# Altium schematic symbol library FPGA_Xilinx_Virtex7.SchLib: 34 symbols (part 33 of 34)
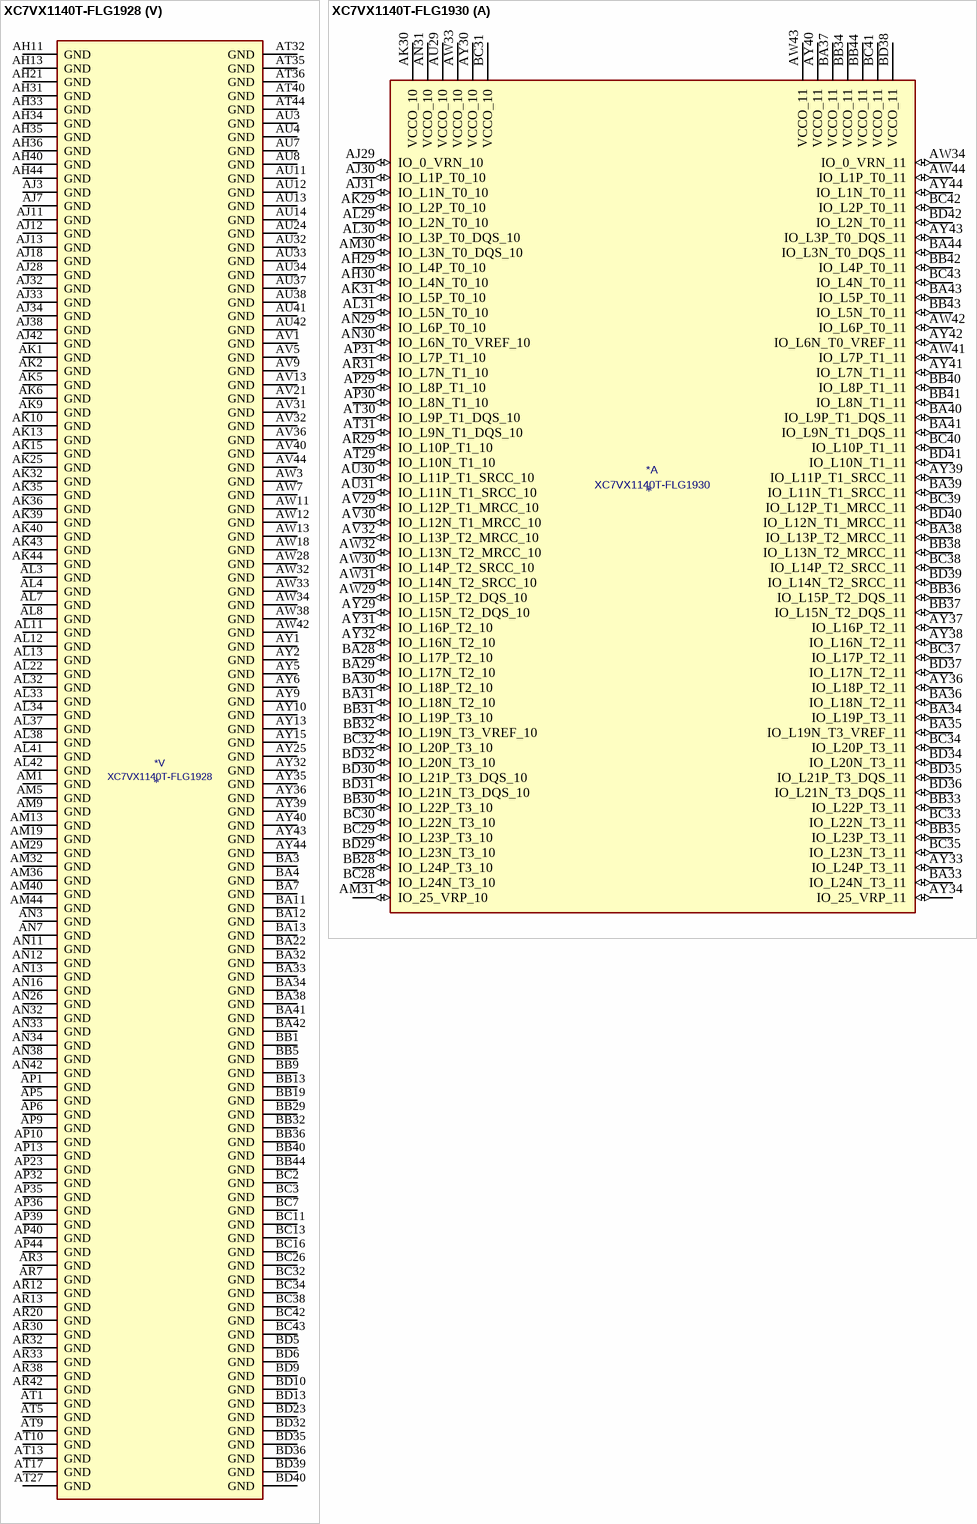
[diagram p204: symbols XC7VX1140T-FLG1928 to XC7VX1140T-FLG1930]

## XC7VX1140T-FLG1928
designator *  value XC7VX1140T-FLG1928
ki_keywords: FPGA; ki_description: Virtex 7 XT 1140 XC7VX1140T-FLG1928
part A pins: AG28 IO_L1P_T0_D00_MOSI_14 (io), AG30 IO_L2P_T0_D02_14 (io), AH25 IO_L2P_T0_13 (io), AH26 VCCO_13 (power), AH27 IO_L1P_T0_13 (io), AH28 IO_L1N_T0_D01_DIN_14 (io), AH29 IO_L3P_T0_DQS_PUDC_B_14 (io), AH30 IO_L2N_T0_D03_14 (io), AJ25 IO_L2N_T0_13 (io), AJ26 IO_L4P_T0_13 (io), AJ27 IO_L1N_T0_13 (io), AJ29 IO_L3N_T0_DQS_EMCCLK_14 (io), AJ30 IO_L4P_T0_D04_14 (io), AJ31 IO_L4N_T0_D05_14 (io), AK26 IO_L4N_T0_13 (io), AK27 IO_25_VRP_13 (io), AK28 IO_L5P_T0_D06_14 (io), AK29 IO_L5N_T0_D07_14 (io), AK30 VCCO_14 (power), AK31 IO_0_VRN_14 (io), AL25 IO_0_VRN_13 (io), AL26 IO_L5P_T0_13 (io), AL27 VCCO_13 (power), AL28 IO_25_VRP_14 (io), AL29 IO_L6P_T0_FCS_B_14 (io), AL30 IO_L6N_T0_D08_VREF_14 (io), AL31 IO_L7P_T1_D09_14 (io), AM25 IO_L3P_T0_DQS_13 (io), AM26 IO_L5N_T0_13 (io), AM27 IO_L6P_T0_13 (io), AM28 IO_L9P_T1_DQS_14 (io), AM30 IO_L8P_T1_D11_14 (io), AM31 IO_L7N_T1_D10_14 (io), AN25 IO_L3N_T0_DQS_13 (io), AN27 IO_L6N_T0_VREF_13 (io), AN28 IO_L9N_T1_DQS_D13_14 (io), AN29 IO_L10P_T1_D14_14 (io), AN30 IO_L8N_T1_D12_14 (io), AN31 VCCO_14 (power), AP25 IO_L8P_T1_13 (io), AP26 IO_L8N_T1_13 (io), AP27 IO_L9P_T1_DQS_13 (io), AP28 VCCO_14 (power), AP29 IO_L12P_T1_MRCC_14 (io), AP30 IO_L10N_T1_D15_14 (io), AP31 IO_L11P_T1_SRCC_14 (io), AR25 VCCO_13 (power), AR26 IO_L7P_T1_13 (io), AR27 IO_L9N_T1_DQS_13 (io), AR28 IO_L14P_T2_SRCC_14 (io), AR29 IO_L12N_T1_MRCC_14 (io), AR31 IO_L11N_T1_SRCC_14 (io), AT25 IO_L10P_T1_13 (io), AT26 IO_L7N_T1_13 (io), AT28 IO_L14N_T2_SRCC_14 (io), AT29 IO_L13P_T2_MRCC_14 (io), AT30 IO_L13N_T2_MRCC_14 (io), AT31 IO_L15P_T2_DQS_RDWR_B_14 (io), AU25 IO_L11P_T1_SRCC_13 (io), AU26 IO_L10N_T1_13 (io), AU27 IO_L12P_T1_MRCC_13 (io), AU28 IO_L12N_T1_MRCC_13 (io), AU29 VCCO_14 (power), AU30 IO_L17P_T2_A14_D30_14 (io), AU31 IO_L15N_T2_DQS_DOUT_CSO_B_14 (io), AV25 IO_L11N_T1_SRCC_13 (io), AV26 VCCO_13 (power), AV27 IO_L14P_T2_SRCC_13 (io), AV28 IO_L14N_T2_SRCC_13 (io), AV29 IO_L18P_T2_A12_D28_14 (io), AV30 IO_L17N_T2_A13_D29_14 (io), AW25 IO_L13P_T2_MRCC_13 (io), AW26 IO_L13N_T2_MRCC_13 (io), AW27 IO_L15P_T2_DQS_13 (io), AW29 IO_L18N_T2_A11_D27_14 (io), AW30 IO_L16P_T2_CSI_B_14 (io), AW31 IO_L16N_T2_A15_D31_14 (io), AY26 IO_L18P_T2_13 (io), AY27 IO_L15N_T2_DQS_13 (io), AY28 IO_L17P_T2_13 (io), AY29 IO_L19P_T3_A10_D26_14 (io), AY30 VCCO_14 (power), AY31 IO_L20P_T3_A08_D24_14 (io), BA24 IO_L16P_T2_13 (io), BA25 IO_L16N_T2_13 (io), BA26 IO_L18N_T2_13 (io), BA27 VCCO_13 (power), BA28 IO_L17N_T2_13 (io), BA29 IO_L19N_T3_A09_D25_VREF_14 (io), BA30 IO_L22P_T3_A05_D21_14 (io), BA31 IO_L20N_T3_A07_D23_14 (io), BB24 VCCO_13 (power), BB25 IO_L19P_T3_13 (io), BB26 IO_L19N_T3_VREF_13 (io), BB27 IO_L20P_T3_13 (io), BB28 IO_L24P_T3_13 (io), BB30 IO_L24P_T3_A01_D17_14 (io), BB31 IO_L22N_T3_A04_D20_14 (io), BC24 IO_L21P_T3_DQS_13 (io), BC25 IO_L21N_T3_DQS_13 (io), BC27 IO_L20N_T3_13 (io), BC28 IO_L24N_T3_13 (io), BC29 IO_L23P_T3_A03_D19_14 (io), BC30 IO_L24N_T3_A00_D16_14 (io), BC31 VCCO_14 (power), BD24 IO_L23P_T3_13 (io), BD25 IO_L23N_T3_13 (io), BD26 IO_L22P_T3_13 (io), BD27 IO_L22N_T3_13 (io), BD28 VCCO_13 (power), BD29 IO_L23N_T3_A02_D18_14 (io), BD30 IO_L21P_T3_DQS_14 (io), BD31 IO_L21N_T3_DQS_A06_D22_14 (io)
part B pins: A25 IO_L16P_T2_16 (io), A26 IO_L16N_T2_16 (io), A27 VCCO_16 (power), A28 IO_L15N_T2_DQS_16 (io), A29 IO_L24P_T3_RS1_15 (io), A30 IO_L24N_T3_RS0_15 (io), A31 IO_L23N_T3_FWE_B_15 (io), B25 IO_L18N_T2_16 (io), B26 IO_L17P_T2_16 (io), B27 IO_L17N_T2_16 (io), B28 IO_L15P_T2_DQS_16 (io), B30 IO_L22N_T3_A16_15 (io), B31 IO_L23P_T3_FOE_B_15 (io), C25 IO_L18P_T2_16 (io), C27 IO_L19P_T3_16 (io), C28 IO_L19N_T3_VREF_16 (io), C29 IO_L22P_T3_A17_15 (io), C30 IO_L21N_T3_DQS_A18_15 (io), C31 VCCO_15 (power), D25 IO_L13P_T2_MRCC_16 (io), D26 IO_L13N_T2_MRCC_16 (io), D27 IO_L11N_T1_SRCC_16 (io), D28 VCCO_15 (power), D29 IO_L20N_T3_A19_15 (io), D30 IO_L21P_T3_DQS_15 (io), D31 IO_L19N_T3_A21_VREF_15 (io), E25 VCCO_16 (power), E26 IO_L14N_T2_SRCC_16 (io), E27 IO_L11P_T1_SRCC_16 (io), E28 IO_L12N_T1_MRCC_16 (io), E29 IO_L20P_T3_A20_15 (io), E31 IO_L19P_T3_A22_15 (io), F26 IO_L14P_T2_SRCC_16 (io), F28 IO_L12P_T1_MRCC_16 (io), F29 IO_L17P_T2_A26_15 (io), F30 IO_L17N_T2_A25_15 (io), F31 IO_L18N_T2_A23_15 (io), G26 IO_L7P_T1_16 (io), G27 IO_L7N_T1_16 (io), G28 IO_L6N_T0_VREF_16 (io), G29 VCCO_15 (power), G30 IO_L15N_T2_DQS_ADV_B_15 (io), G31 IO_L18P_T2_A24_15 (io), H26 VCCO_16 (power), H27 IO_L10N_T1_16 (io), H28 IO_L6P_T0_16 (io), H29 IO_L15P_T2_DQS_15 (io), H30 IO_L16N_T2_A27_15 (io), J26 IO_L9N_T1_DQS_16 (io), J27 IO_L10P_T1_16 (io), J29 IO_L13N_T2_MRCC_15 (io), J30 IO_L16P_T2_A28_15 (io), J31 IO_L14N_T2_SRCC_15 (io), K26 IO_L9P_T1_DQS_16 (io), K27 IO_L8P_T1_16 (io), K28 IO_L8N_T1_16 (io), K29 IO_L13P_T2_MRCC_15 (io), K30 VCCO_15 (power), K31 IO_L14P_T2_SRCC_15 (io), L26 IO_25_VRP_16 (io), L27 VCCO_16 (power), L28 IO_0_VRN_16 (io), L29 IO_L12P_T1_MRCC_15 (io), L30 IO_L12N_T1_MRCC_15 (io), L31 IO_L11N_T1_SRCC_15 (io), M26 IO_L10P_T1_AD11P_15 (io), M27 IO_L10N_T1_AD11N_15 (io), M28 IO_L8N_T1_AD10N_15 (io), M30 IO_L9N_T1_DQS_AD3N_15 (io), M31 IO_L11P_T1_SRCC_15 (io), N27 IO_L8P_T1_AD10P_15 (io), N28 IO_L7P_T1_AD2P_15 (io), N29 IO_L7N_T1_AD2N_15 (io), N30 IO_L9P_T1_DQS_AD3P_15 (io), N31 VCCO_15 (power), P26 IO_L2N_T0_AD8N_15 (io), P27 IO_L4N_T0_15 (io), P28 VCCO_15 (power), P29 IO_L6P_T0_15 (io), P30 IO_L6N_T0_VREF_15 (io), P31 IO_L5N_T0_AD9N_15 (io), R26 IO_L2P_T0_AD8P_15 (io), R27 IO_L4P_T0_15 (io), R28 IO_L1N_T0_AD0N_15 (io), R29 IO_L3N_T0_DQS_AD1N_15 (io), R31 IO_L5P_T0_AD9P_15 (io), T26 IO_0_VRN_15 (io), T28 IO_L1P_T0_AD0P_15 (io), T29 IO_L3P_T0_DQS_AD1P_15 (io), T30 IO_25_VRP_15 (io)
part C pins: AG16 IO_25_VRP_34 (io), AG20 IO_0_VRN_33 (io), AH14 IO_0_VRN_34 (io), AH15 IO_L1P_T0_34 (io), AH16 VCCO_34 (power), AH17 IO_L1P_T0_33 (io), AH18 IO_L2N_T0_33 (io), AH19 IO_L2P_T0_33 (io), AH20 IO_L4P_T0_33 (io), AJ14 IO_L2P_T0_34 (io), AJ15 IO_L1N_T0_34 (io), AJ16 IO_L3P_T0_DQS_34 (io), AJ17 IO_L1N_T0_33 (io), AJ19 IO_L3P_T0_DQS_33 (io), AJ20 IO_L4N_T0_33 (io), AK14 IO_L2N_T0_34 (io), AK16 IO_L3N_T0_DQS_34 (io), AK17 IO_25_VRP_33 (io), AK18 IO_L5P_T0_33 (io), AK19 IO_L3N_T0_DQS_33 (io), AK20 VCCO_33 (power), AL14 IO_L4N_T0_34 (io), AL15 IO_L4P_T0_34 (io), AL16 IO_L5P_T0_34 (io), AL17 VCCO_33 (power), AL18 IO_L5N_T0_33 (io), AL19 IO_L6N_T0_VREF_33 (io), AL20 IO_L6P_T0_33 (io), AM14 VCCO_34 (power), AM15 IO_L6P_T0_34 (io), AM16 IO_L5N_T0_34 (io), AM17 IO_L7N_T1_33 (io), AM18 IO_L7P_T1_33 (io), AM20 IO_L8P_T1_33 (io), AN14 IO_L8P_T1_34 (io), AN15 IO_L6N_T0_VREF_34 (io), AN17 IO_L9P_T1_DQS_33 (io), AN18 IO_L10N_T1_33 (io), AN19 IO_L10P_T1_33 (io), AN20 IO_L8N_T1_33 (io), AP14 IO_L8N_T1_34 (io), AP15 IO_L10P_T1_34 (io), AP16 IO_L7P_T1_34 (io), AP17 IO_L9N_T1_DQS_33 (io), AP18 VCCO_33 (power), AP19 IO_L11N_T1_SRCC_33 (io), AP20 IO_L11P_T1_SRCC_33 (io), AR14 IO_L10N_T1_34 (io), AR15 VCCO_34 (power), AR16 IO_L7N_T1_34 (io), AR17 IO_L9P_T1_DQS_34 (io), AR18 IO_L12N_T1_MRCC_33 (io), AR19 IO_L12P_T1_MRCC_33 (io), AT14 IO_L12N_T1_MRCC_34 (io), AT15 IO_L12P_T1_MRCC_34 (io), AT16 IO_L9N_T1_DQS_34 (io), AT18 IO_L14N_T2_SRCC_33 (io), AT19 IO_L14P_T2_SRCC_33 (io), AT20 IO_L13P_T2_MRCC_33 (io), AU15 IO_L13P_T2_MRCC_34 (io), AU16 IO_L11N_T1_SRCC_34 (io), AU17 IO_L11P_T1_SRCC_34 (io), AU18 IO_L18P_T2_33 (io), AU19 VCCO_33 (power), AU20 IO_L13N_T2_MRCC_33 (io), AV14 IO_L15P_T2_DQS_34 (io), AV15 IO_L13N_T2_MRCC_34 (io), AV16 VCCO_34 (power), AV17 IO_L14P_T2_SRCC_34 (io), AV18 IO_L18N_T2_33 (io), AV19 IO_L17P_T2_33 (io), AV20 IO_L15P_T2_DQS_33 (io), AW14 IO_L15N_T2_DQS_34 (io), AW15 IO_L17N_T2_34 (io), AW16 IO_L17P_T2_34 (io), AW17 IO_L14N_T2_SRCC_34 (io), AW19 IO_L17N_T2_33 (io), AW20 IO_L15N_T2_DQS_33 (io), AY14 IO_L16P_T2_34 (io), AY16 IO_L18N_T2_34 (io), AY17 IO_L18P_T2_34 (io), AY18 IO_L16N_T2_33 (io), AY19 IO_L16P_T2_33 (io), AY20 VCCO_33 (power), AY21 IO_L20P_T3_33 (io), BA14 IO_L16N_T2_34 (io), BA15 IO_L19N_T3_VREF_34 (io), BA16 IO_L19P_T3_34 (io), BA17 VCCO_34 (power), BA18 IO_L21P_T3_DQS_33 (io), BA19 IO_L19N_T3_VREF_33 (io), BA20 IO_L19P_T3_33 (io), BA21 IO_L20N_T3_33 (io), BB14 VCCO_34 (power), BB15 IO_L20N_T3_34 (io), BB16 IO_L20P_T3_34 (io), BB17 IO_L22P_T3_34 (io), BB18 IO_L21N_T3_DQS_33 (io), BB20 IO_L22P_T3_33 (io), BC14 IO_L21N_T3_DQS_34 (io), BC15 IO_L21P_T3_DQS_34 (io), BC17 IO_L22N_T3_34 (io), BC18 IO_L23N_T3_33 (io), BC19 IO_L23P_T3_33 (io), BC20 IO_L22N_T3_33 (io), BD14 IO_L23N_T3_34 (io), BD15 IO_L23P_T3_34 (io), BD16 IO_L24N_T3_34 (io), BD17 IO_L24P_T3_34 (io), BD18 VCCO_33 (power), BD19 IO_L24N_T3_33 (io), BD20 IO_L24P_T3_33 (io)
part D pins: A23 IO_L24P_T3_36 (io), A24 IO_L24N_T3_36 (io), AG22 IO_0_VRN_35 (io), AH22 IO_L4P_T0_35 (io), AH23 IO_L2P_T0_AD12P_35 (io), AH24 IO_L2N_T0_AD12N_35 (io), AJ21 IO_L5P_T0_AD13P_35 (io), AJ22 IO_L4N_T0_35 (io), AJ23 VCCO_35 (power), AJ24 IO_L1P_T0_AD4P_35 (io), AK21 IO_L5N_T0_AD13N_35 (io), AK22 IO_L3P_T0_DQS_AD5P_35 (io), AK23 IO_L3N_T0_DQS_AD5N_35 (io), AK24 IO_L1N_T0_AD4N_35 (io), AL21 IO_25_VRP_35 (io), AL23 IO_L6P_T0_35 (io), AL24 IO_L6N_T0_VREF_35 (io), AM21 IO_L7P_T1_AD6P_35 (io), AM22 IO_L7N_T1_AD6N_35 (io), AM23 IO_L8P_T1_AD14P_35 (io), AM24 VCCO_35 (power), AN21 VCCO_35 (power), AN22 IO_L9P_T1_DQS_AD7P_35 (io), AN23 IO_L8N_T1_AD14N_35 (io), AN24 IO_L10P_T1_AD15P_35 (io), AP21 IO_L11P_T1_SRCC_35 (io), AP22 IO_L9N_T1_DQS_AD7N_35 (io), AP24 IO_L10N_T1_AD15N_35 (io), AR21 IO_L11N_T1_SRCC_35 (io), AR22 IO_L12P_T1_MRCC_35 (io), AR23 IO_L12N_T1_MRCC_35 (io), AR24 IO_L13P_T2_MRCC_35 (io), AT21 IO_L15P_T2_DQS_35 (io), AT22 VCCO_35 (power), AT23 IO_L14P_T2_SRCC_35 (io), AT24 IO_L13N_T2_MRCC_35 (io), AU21 IO_L15N_T2_DQS_35 (io), AU22 IO_L16P_T2_35 (io), AU23 IO_L14N_T2_SRCC_35 (io), AV22 IO_L16N_T2_35 (io), AV23 IO_L18P_T2_35 (io), AV24 IO_L18N_T2_35 (io), AW21 IO_L17P_T2_35 (io), AW22 IO_L17N_T2_35 (io), AW23 VCCO_35 (power), AW24 IO_L20P_T3_35 (io), AY22 IO_L19P_T3_35 (io), AY23 IO_L19N_T3_VREF_35 (io), AY24 IO_L20N_T3_35 (io), B22 IO_L21N_T3_DQS_36 (io), B23 IO_L23N_T3_36 (io), B24 VCCO_36 (power), BA23 IO_L22P_T3_35 (io), BB21 IO_L21P_T3_DQS_35 (io), BB22 IO_L21N_T3_DQS_35 (io), BB23 IO_L22N_T3_35 (io), BC21 VCCO_35 (power), BC22 IO_L24P_T3_35 (io), BC23 IO_L24N_T3_35 (io), BD21 IO_L23P_T3_35 (io), BD22 IO_L23N_T3_35 (io), C22 IO_L21P_T3_DQS_36 (io), C23 IO_L23P_T3_36 (io), C24 IO_L22N_T3_36 (io), D22 IO_L20N_T3_36 (io), D24 IO_L22P_T3_36 (io), E22 IO_L20P_T3_36 (io), E23 IO_L19P_T3_36 (io), E24 IO_L19N_T3_VREF_36 (io), F22 VCCO_36 (power), F23 IO_L17P_T2_36 (io), F24 IO_L17N_T2_36 (io), F25 IO_L18N_T2_36 (io), G22 IO_L15P_T2_DQS_36 (io), G23 IO_L15N_T2_DQS_36 (io), G25 IO_L18P_T2_36 (io), H22 IO_L13P_T2_MRCC_36 (io), H23 IO_L13N_T2_MRCC_36 (io), H24 IO_L16P_T2_36 (io), H25 IO_L16N_T2_36 (io), J22 IO_L12N_T1_MRCC_36 (io), J23 VCCO_36 (power), J24 IO_L14P_T2_SRCC_36 (io), J25 IO_L14N_T2_SRCC_36 (io), K22 IO_L12P_T1_MRCC_36 (io), K23 IO_L11P_T1_SRCC_36 (io), K24 IO_L11N_T1_SRCC_36 (io), L23 IO_L7P_T1_36 (io), L24 IO_L7N_T1_36 (io), L25 IO_L9N_T1_DQS_36 (io), M22 IO_L10P_T1_36 (io), M23 IO_L10N_T1_36 (io), M24 VCCO_36 (power), M25 IO_L9P_T1_DQS_36 (io), N22 IO_L8P_T1_36 (io), N23 IO_L8N_T1_36 (io), N24 IO_L6P_T0_36 (io), N25 IO_L6N_T0_VREF_36 (io), P21 IO_L2N_T0_36 (io), P22 IO_L4N_T0_36 (io), P24 IO_L3N_T0_DQS_36 (io), P25 IO_25_VRP_36 (io), R21 IO_L2P_T0_36 (io), R22 IO_L4P_T0_36 (io), R23 IO_L1N_T0_36 (io), R24 IO_L3P_T0_DQS_36 (io), R25 VCCO_36 (power), T21 IO_0_VRN_36 (io), T22 VCCO_36 (power), T23 IO_L1P_T0_36 (io), T24 IO_L5P_T0_36 (io), T25 IO_L5N_T0_36 (io)
part E pins: A14 IO_L24N_T3_37 (io), A15 IO_L24P_T3_37 (io), A16 IO_L23N_T3_37 (io), A17 VCCO_37 (power), A18 IO_L20N_T3_38 (io), A19 IO_L20P_T3_38 (io), A20 IO_L22N_T3_38 (io), A21 IO_L24N_T3_38 (io), B14 VCCO_37 (power), B15 IO_L22N_T3_37 (io), B16 IO_L23P_T3_37 (io), B17 IO_L21N_T3_DQS_37 (io), B18 IO_L23N_T3_38 (io), B20 IO_L22P_T3_38 (io), B21 IO_L24P_T3_38 (io), C14 IO_L20N_T3_37 (io), C15 IO_L22P_T3_37 (io), C17 IO_L21P_T3_DQS_37 (io), C18 IO_L23P_T3_38 (io), C19 IO_L21N_T3_DQS_38 (io), C20 IO_L21P_T3_DQS_38 (io), C21 VCCO_38 (power), D14 IO_L20P_T3_37 (io), D15 IO_L19N_T3_VREF_37 (io), D16 IO_L19P_T3_37 (io), D17 IO_L15N_T2_DQS_38 (io), D18 VCCO_38 (power), D19 IO_L17N_T2_38 (io), D20 IO_L19N_T3_VREF_38 (io), D21 IO_L19P_T3_38 (io), E14 IO_L18N_T2_37 (io), E15 VCCO_37 (power), E16 IO_L17N_T2_37 (io), E17 IO_L17P_T2_37 (io), E18 IO_L15P_T2_DQS_38 (io), E19 IO_L17P_T2_38 (io), E21 IO_L18N_T2_38 (io), F14 IO_L18P_T2_37 (io), F15 IO_L16N_T2_37 (io), F16 IO_L15N_T2_DQS_37 (io), F18 IO_L13N_T2_MRCC_38 (io), F19 IO_L16N_T2_38 (io), F20 IO_L16P_T2_38 (io), F21 IO_L18P_T2_38 (io), G15 IO_L16P_T2_37 (io), G16 IO_L15P_T2_DQS_37 (io), G17 IO_L13N_T2_MRCC_37 (io), G18 IO_L13P_T2_MRCC_38 (io), G19 VCCO_38 (power), G20 IO_L14N_T2_SRCC_38 (io), G21 IO_L14P_T2_SRCC_38 (io), H14 IO_L14N_T2_SRCC_37 (io), H15 IO_L14P_T2_SRCC_37 (io), H16 VCCO_37 (power), H17 IO_L13P_T2_MRCC_37 (io), H18 IO_L12N_T1_MRCC_38 (io), H19 IO_L12P_T1_MRCC_38 (io), H20 IO_L11N_T1_SRCC_38 (io), J14 IO_L11N_T1_SRCC_37 (io), J15 IO_L11P_T1_SRCC_37 (io), J16 IO_L12N_T1_MRCC_37 (io), J17 IO_L12P_T1_MRCC_37 (io), J19 IO_L10N_T1_38 (io), J20 IO_L11P_T1_SRCC_38 (io), J21 IO_L9N_T1_DQS_38 (io), K14 IO_L9N_T1_DQS_37 (io), K16 IO_L7N_T1_37 (io), K17 IO_L7P_T1_37 (io), K18 IO_L8N_T1_38 (io), K19 IO_L10P_T1_38 (io), K20 VCCO_38 (power), K21 IO_L9P_T1_DQS_38 (io), L14 IO_L9P_T1_DQS_37 (io), L15 IO_L10N_T1_37 (io), L16 IO_L10P_T1_37 (io), L17 VCCO_37 (power), L18 IO_L6N_T0_VREF_38 (io), L19 IO_L8P_T1_38 (io), L20 IO_L7N_T1_38 (io), L21 IO_L7P_T1_38 (io), M14 VCCO_37 (power), M15 IO_L6N_T0_VREF_37 (io), M16 IO_L8N_T1_37 (io), M17 IO_L8P_T1_37 (io), M18 IO_L6P_T0_38 (io), M20 IO_L3N_T0_DQS_38 (io), M21 IO_L3P_T0_DQS_38 (io), N14 IO_25_VRP_37 (io), N15 IO_L6P_T0_37 (io), N17 IO_L2N_T0_37 (io), N18 IO_0_VRN_38 (io), N19 IO_L2N_T0_38 (io), N20 IO_L1N_T0_38 (io), N21 VCCO_38 (power), P14 IO_L3N_T0_DQS_37 (io), P15 IO_L3P_T0_DQS_37 (io), P16 IO_L4N_T0_37 (io), P17 IO_L2P_T0_37 (io), P18 VCCO_38 (power), P19 IO_L2P_T0_38 (io), P20 IO_L1P_T0_38 (io), R14 IO_L5N_T0_37 (io), R15 VCCO_37 (power), R16 IO_L4P_T0_37 (io), R17 IO_0_VRN_37 (io), R18 IO_L4N_T0_38 (io), R19 IO_L5N_T0_38 (io), T14 IO_L5P_T0_37 (io), T15 IO_L1N_T0_37 (io), T16 IO_L1P_T0_37 (io), T18 IO_L4P_T0_38 (io), T19 IO_L5P_T0_38 (io), T20 IO_25_VRP_38 (io)
part F pins: AR9 MGTREFCLK0N_111 (io), AR10 MGTREFCLK0P_111 (io), AT11 MGTREFCLK1N_111 (io), AT12 MGTREFCLK1P_111 (io), AU9 MGTREFCLK0N_110 (io), AU10 MGTREFCLK0P_110 (io), AV11 MGTREFCLK1N_110 (io), AV12 MGTREFCLK1P_110 (io), AW1 MGTHTXN3_111 (io), AW2 MGTHTXP3_111 (io), AW5 MGTHRXN3_111 (io), AW6 MGTHRXP3_111 (io), AW9 MGTHRXN2_111 (io), AW10 MGTHRXP2_111 (io), AY3 MGTHTXN2_111 (io), AY4 MGTHTXP2_111 (io), AY7 MGTHRXN1_111 (io), AY8 MGTHRXP1_111 (io), BA1 MGTHTXN1_111 (io), BA2 MGTHTXP1_111 (io), BA5 MGTHTXN0_111 (io), BA6 MGTHTXP0_111 (io), BA9 MGTHRXN0_111 (io), BA10 MGTHRXP0_111 (io), BB3 MGTHTXN3_110 (io), BB4 MGTHTXP3_110 (io), BB7 MGTHRXN3_110 (io), BB8 MGTHRXP3_110 (io), BB11 MGTHRXN2_110 (io), BB12 MGTHRXP2_110 (io), BC5 MGTHTXN2_110 (io), BC6 MGTHTXP2_110 (io), BC9 MGTHRXN1_110 (io), BC10 MGTHRXP1_110 (io), BD3 MGTHTXN1_110 (io), BD4 MGTHTXP1_110 (io), BD7 MGTHTXN0_110 (io), BD8 MGTHTXP0_110 (io), BD11 MGTHRXN0_110 (io), BD12 MGTHRXP0_110 (io)
part G pins: AL1 MGTHTXN3_113 (io), AL2 MGTHTXP3_113 (io), AL5 MGTHRXN3_113 (io), AL6 MGTHRXP3_113 (io), AL9 MGTREFCLK0N_113 (io), AL10 MGTREFCLK0P_113 (io), AM3 MGTHTXN2_113 (io), AM4 MGTHTXP2_113 (io), AM7 MGTHRXN2_113 (io), AM8 MGTHRXP2_113 (io), AM11 MGTREFCLK1N_113 (io), AM12 MGTREFCLK1P_113 (io), AN1 MGTHTXN1_113 (io), AN2 MGTHTXP1_113 (io), AN5 MGTHRXN1_113 (io), AN6 MGTHRXP1_113 (io), AN9 MGTREFCLK0N_112 (io), AN10 MGTREFCLK0P_112 (io), AP3 MGTHTXN0_113 (io), AP4 MGTHTXP0_113 (io), AP7 MGTHRXN0_113 (io), AP8 MGTHRXP0_113 (io), AP11 MGTREFCLK1N_112 (io), AP12 MGTREFCLK1P_112 (io), AR1 MGTHTXN3_112 (io), AR2 MGTHTXP3_112 (io), AR5 MGTHRXN3_112 (io), AR6 MGTHRXP3_112 (io), AT3 MGTHTXN2_112 (io), AT4 MGTHTXP2_112 (io), AT7 MGTHRXN2_112 (io), AT8 MGTHRXP2_112 (io), AU1 MGTHTXN1_112 (io), AU2 MGTHTXP1_112 (io), AU5 MGTHRXN1_112 (io), AU6 MGTHRXP1_112 (io), AV3 MGTHTXN0_112 (io), AV4 MGTHTXP0_112 (io), AV7 MGTHRXN0_112 (io), AV8 MGTHRXP0_112 (io)
part H pins: AC1 MGTHTXN3_115 (io), AC2 MGTHTXP3_115 (io), AC5 MGTHRXN3_115 (io), AC6 MGTHRXP3_115 (io), AC9 MGTREFCLK0N_115 (io), AC10 MGTREFCLK0P_115 (io), AD3 MGTHTXN2_115 (io), AD4 MGTHTXP2_115 (io), AD7 MGTHRXN2_115 (io), AD8 MGTHRXP2_115 (io), AE1 MGTHTXN1_115 (io), AE2 MGTHTXP1_115 (io), AE5 MGTHRXN1_115 (io), AE6 MGTHRXP1_115 (io), AE9 MGTREFCLK1N_115 (io), AE10 MGTREFCLK1P_115 (io), AF3 MGTHTXN0_115 (io), AF4 MGTHTXP0_115 (io), AF7 MGTHRXN0_115 (io), AF8 MGTHRXP0_115 (io), AG1 MGTHTXN3_114 (io), AG2 MGTHTXP3_114 (io), AG5 MGTHRXN3_114 (io), AG6 MGTHRXP3_114 (io), AG9 MGTREFCLK0N_114 (io), AG10 MGTREFCLK0P_114 (io), AH3 MGTHTXN2_114 (io), AH4 MGTHTXP2_114 (io), AH7 MGTHRXN2_114 (io), AH8 MGTHRXP2_114 (io), AJ1 MGTHTXN1_114 (io), AJ2 MGTHTXP1_114 (io), AJ5 MGTHRXN1_114 (io), AJ6 MGTHRXP1_114 (io), AJ9 MGTREFCLK1N_114 (io), AJ10 MGTREFCLK1P_114 (io), AK3 MGTHTXN0_114 (io), AK4 MGTHTXP0_114 (io), AK7 MGTHRXN0_114 (io), AK8 MGTHRXP0_114 (io)
part I pins: AA1 MGTHTXN1_116 (io), AA2 MGTHTXP1_116 (io), AA5 MGTHRXN1_116 (io), AA6 MGTHRXP1_116 (io), AA9 MGTREFCLK1N_116 (io), AA10 MGTREFCLK1P_116 (io), AB3 MGTHTXN0_116 (io), AB4 MGTHTXP0_116 (io), AB7 MGTHRXN0_116 (io), AB8 MGTHRXP0_116 (io), R1 MGTHTXN3_117 (io), R2 MGTHTXP3_117 (io), R5 MGTHRXN3_117 (io), R6 MGTHRXP3_117 (io), R9 MGTREFCLK0N_117 (io), R10 MGTREFCLK0P_117 (io), T3 MGTHTXN2_117 (io), T4 MGTHTXP2_117 (io), T7 MGTHRXN2_117 (io), T8 MGTHRXP2_117 (io), U1 MGTHTXN1_117 (io), U2 MGTHTXP1_117 (io), U5 MGTHRXN1_117 (io), U6 MGTHRXP1_117 (io), U9 MGTREFCLK1N_117 (io), U10 MGTREFCLK1P_117 (io), V3 MGTHTXN0_117 (io), V4 MGTHTXP0_117 (io), V7 MGTHRXN0_117 (io), V8 MGTHRXP0_117 (io), W1 MGTHTXN3_116 (io), W2 MGTHTXP3_116 (io), W5 MGTHRXN3_116 (io), W6 MGTHRXP3_116 (io), W9 MGTREFCLK0N_116 (io), W10 MGTREFCLK0P_116 (io), Y3 MGTHTXN2_116 (io), Y4 MGTHTXP2_116 (io), Y7 MGTHRXN2_116 (io), Y8 MGTHRXP2_116 (io)
part J pins: G1 MGTHTXN3_119 (io), G2 MGTHTXP3_119 (io), G5 MGTHRXN3_119 (io), G6 MGTHRXP3_119 (io), H3 MGTHTXN2_119 (io), H4 MGTHTXP2_119 (io), H7 MGTHRXN2_119 (io), H8 MGTHRXP2_119 (io), J1 MGTHTXN1_119 (io), J2 MGTHTXP1_119 (io), J5 MGTHRXN1_119 (io), J6 MGTHRXP1_119 (io), K3 MGTHTXN0_119 (io), K4 MGTHTXP0_119 (io), K7 MGTHRXN0_119 (io), K8 MGTHRXP0_119 (io), L1 MGTHTXN3_118 (io), L2 MGTHTXP3_118 (io), L5 MGTHRXN3_118 (io), L6 MGTHRXP3_118 (io), L9 MGTREFCLK0N_119 (io), L10 MGTREFCLK0P_119 (io), M3 MGTHTXN2_118 (io), M4 MGTHTXP2_118 (io), M7 MGTHRXN2_118 (io), M8 MGTHRXP2_118 (io), M11 MGTREFCLK1N_119 (io), M12 MGTREFCLK1P_119 (io), N1 MGTHTXN1_118 (io), N2 MGTHTXP1_118 (io), N5 MGTHRXN1_118 (io), N6 MGTHRXP1_118 (io), N9 MGTREFCLK0N_118 (io), N10 MGTREFCLK0P_118 (io), P3 MGTHTXN0_118 (io), P4 MGTHTXP0_118 (io), P7 MGTHRXN0_118 (io), P8 MGTHRXP0_118 (io), P11 MGTREFCLK1N_118 (io), P12 MGTREFCLK1P_118 (io)
part K pins: A5 MGTHTXN3_121 (io), A6 MGTHTXP3_121 (io), A9 MGTHRXN3_121 (io), A10 MGTHRXP3_121 (io), B3 MGTHTXN1_121 (io), B4 MGTHTXP1_121 (io), B7 MGTHTXN2_121 (io), B8 MGTHTXP2_121 (io), B11 MGTHRXN2_121 (io), B12 MGTHRXP2_121 (io), C1 MGTHTXN3_120 (io), C2 MGTHTXP3_120 (io), C5 MGTHTXN0_121 (io), C6 MGTHTXP0_121 (io), C9 MGTHRXN1_121 (io), C10 MGTHRXP1_121 (io), D3 MGTHTXN2_120 (io), D4 MGTHTXP2_120 (io), D7 MGTHRXN3_120 (io), D8 MGTHRXP3_120 (io), D11 MGTHRXN0_121 (io), D12 MGTHRXP0_121 (io), E1 MGTHTXN1_120 (io), E2 MGTHTXP1_120 (io), E5 MGTHRXN1_120 (io), E6 MGTHRXP1_120 (io), E9 MGTHRXN2_120 (io), E10 MGTHRXP2_120 (io), F3 MGTHTXN0_120 (io), F4 MGTHTXP0_120 (io), F7 MGTHRXN0_120 (io), F8 MGTHRXP0_120 (io), G9 MGTREFCLK0N_121 (io), G10 MGTREFCLK0P_121 (io), H11 MGTREFCLK1N_121 (io), H12 MGTREFCLK1P_121 (io), J9 MGTREFCLK0N_120 (io), J10 MGTREFCLK0P_120 (io), K11 MGTREFCLK1N_120 (io), K12 MGTREFCLK1P_120 (io)
part L pins: AR35 MGTREFCLK0P_211 (io), AR36 MGTREFCLK0N_211 (io), AT33 MGTREFCLK1P_211 (io), AT34 MGTREFCLK1N_211 (io), AU35 MGTREFCLK0P_210 (io), AU36 MGTREFCLK0N_210 (io), AV33 MGTREFCLK1P_210 (io), AV34 MGTREFCLK1N_210 (io), AW35 MGTHRXP2_211 (io), AW36 MGTHRXN2_211 (io), AW39 MGTHRXP3_211 (io), AW40 MGTHRXN3_211 (io), AW43 MGTHTXP3_211 (io), AW44 MGTHTXN3_211 (io), AY37 MGTHRXP1_211 (io), AY38 MGTHRXN1_211 (io), AY41 MGTHTXP2_211 (io), AY42 MGTHTXN2_211 (io), BA35 MGTHRXP0_211 (io), BA36 MGTHRXN0_211 (io), BA39 MGTHTXP0_211 (io), BA40 MGTHTXN0_211 (io), BA43 MGTHTXP1_211 (io), BA44 MGTHTXN1_211 (io), BB33 MGTHRXP2_210 (io), BB34 MGTHRXN2_210 (io), BB37 MGTHRXP3_210 (io), BB38 MGTHRXN3_210 (io), BB41 MGTHTXP3_210 (io), BB42 MGTHTXN3_210 (io), BC35 MGTHRXP1_210 (io), BC36 MGTHRXN1_210 (io), BC39 MGTHTXP2_210 (io), BC40 MGTHTXN2_210 (io), BD33 MGTHRXP0_210 (io), BD34 MGTHRXN0_210 (io), BD37 MGTHTXP0_210 (io), BD38 MGTHTXN0_210 (io), BD41 MGTHTXP1_210 (io), BD42 MGTHTXN1_210 (io)
part M pins: AL35 MGTREFCLK0P_213 (io), AL36 MGTREFCLK0N_213 (io), AL39 MGTHRXP3_213 (io), AL40 MGTHRXN3_213 (io), AL43 MGTHTXP3_213 (io), AL44 MGTHTXN3_213 (io), AM33 MGTREFCLK1P_213 (io), AM34 MGTREFCLK1N_213 (io), AM37 MGTHRXP2_213 (io), AM38 MGTHRXN2_213 (io), AM41 MGTHTXP2_213 (io), AM42 MGTHTXN2_213 (io), AN35 MGTREFCLK0P_212 (io), AN36 MGTREFCLK0N_212 (io), AN39 MGTHRXP1_213 (io), AN40 MGTHRXN1_213 (io), AN43 MGTHTXP1_213 (io), AN44 MGTHTXN1_213 (io), AP33 MGTREFCLK1P_212 (io), AP34 MGTREFCLK1N_212 (io), AP37 MGTHRXP0_213 (io), AP38 MGTHRXN0_213 (io), AP41 MGTHTXP0_213 (io), AP42 MGTHTXN0_213 (io), AR39 MGTHRXP3_212 (io), AR40 MGTHRXN3_212 (io), AR43 MGTHTXP3_212 (io), AR44 MGTHTXN3_212 (io), AT37 MGTHRXP2_212 (io), AT38 MGTHRXN2_212 (io), AT41 MGTHTXP2_212 (io), AT42 MGTHTXN2_212 (io), AU39 MGTHRXP1_212 (io), AU40 MGTHRXN1_212 (io), AU43 MGTHTXP1_212 (io), AU44 MGTHTXN1_212 (io), AV37 MGTHRXP0_212 (io), AV38 MGTHRXN0_212 (io), AV41 MGTHTXP0_212 (io), AV42 MGTHTXN0_212 (io)
part N pins: AC35 MGTREFCLK0P_215 (io), AC36 MGTREFCLK0N_215 (io), AC39 MGTHRXP3_215 (io), AC40 MGTHRXN3_215 (io), AC43 MGTHTXP3_215 (io), AC44 MGTHTXN3_215 (io), AD37 MGTHRXP2_215 (io), AD38 MGTHRXN2_215 (io), AD41 MGTHTXP2_215 (io), AD42 MGTHTXN2_215 (io), AE35 MGTREFCLK1P_215 (io), AE36 MGTREFCLK1N_215 (io), AE39 MGTHRXP1_215 (io), AE40 MGTHRXN1_215 (io), AE43 MGTHTXP1_215 (io), AE44 MGTHTXN1_215 (io), AF37 MGTHRXP0_215 (io), AF38 MGTHRXN0_215 (io), AF41 MGTHTXP0_215 (io), AF42 MGTHTXN0_215 (io), AG35 MGTREFCLK0P_214 (io), AG36 MGTREFCLK0N_214 (io), AG39 MGTHRXP3_214 (io), AG40 MGTHRXN3_214 (io), AG43 MGTHTXP3_214 (io), AG44 MGTHTXN3_214 (io), AH37 MGTHRXP2_214 (io), AH38 MGTHRXN2_214 (io), AH41 MGTHTXP2_214 (io), AH42 MGTHTXN2_214 (io), AJ35 MGTREFCLK1P_214 (io), AJ36 MGTREFCLK1N_214 (io), AJ39 MGTHRXP1_214 (io), AJ40 MGTHRXN1_214 (io), AJ43 MGTHTXP1_214 (io), AJ44 MGTHTXN1_214 (io), AK37 MGTHRXP0_214 (io), AK38 MGTHRXN0_214 (io), AK41 MGTHTXP0_214 (io), AK42 MGTHTXN0_214 (io)
part O pins: AA35 MGTREFCLK1P_216 (io), AA36 MGTREFCLK1N_216 (io), AA39 MGTHRXP1_216 (io), AA40 MGTHRXN1_216 (io), AA43 MGTHTXP1_216 (io), AA44 MGTHTXN1_216 (io), AB37 MGTHRXP0_216 (io), AB38 MGTHRXN0_216 (io), AB41 MGTHTXP0_216 (io), AB42 MGTHTXN0_216 (io), R35 MGTREFCLK0P_217 (io), R36 MGTREFCLK0N_217 (io), R39 MGTHRXP3_217 (io), R40 MGTHRXN3_217 (io), R43 MGTHTXP3_217 (io), R44 MGTHTXN3_217 (io), T37 MGTHRXP2_217 (io), T38 MGTHRXN2_217 (io), T41 MGTHTXP2_217 (io), T42 MGTHTXN2_217 (io), U35 MGTREFCLK1P_217 (io), U36 MGTREFCLK1N_217 (io), U39 MGTHRXP1_217 (io), U40 MGTHRXN1_217 (io), U43 MGTHTXP1_217 (io), U44 MGTHTXN1_217 (io), V37 MGTHRXP0_217 (io), V38 MGTHRXN0_217 (io), V41 MGTHTXP0_217 (io), V42 MGTHTXN0_217 (io), W35 MGTREFCLK0P_216 (io), W36 MGTREFCLK0N_216 (io), W39 MGTHRXP3_216 (io), W40 MGTHRXN3_216 (io), W43 MGTHTXP3_216 (io), W44 MGTHTXN3_216 (io), Y37 MGTHRXP2_216 (io), Y38 MGTHRXN2_216 (io), Y41 MGTHTXP2_216 (io), Y42 MGTHTXN2_216 (io)
part P pins: G39 MGTHRXP3_219 (io), G40 MGTHRXN3_219 (io), G43 MGTHTXP3_219 (io), G44 MGTHTXN3_219 (io), H37 MGTHRXP2_219 (io), H38 MGTHRXN2_219 (io), H41 MGTHTXP2_219 (io), H42 MGTHTXN2_219 (io), J39 MGTHRXP1_219 (io), J40 MGTHRXN1_219 (io), J43 MGTHTXP1_219 (io), J44 MGTHTXN1_219 (io), K37 MGTHRXP0_219 (io), K38 MGTHRXN0_219 (io), K41 MGTHTXP0_219 (io), K42 MGTHTXN0_219 (io), L35 MGTREFCLK0P_219 (io), L36 MGTREFCLK0N_219 (io), L39 MGTHRXP3_218 (io), L40 MGTHRXN3_218 (io), L43 MGTHTXP3_218 (io), L44 MGTHTXN3_218 (io), M33 MGTREFCLK1P_219 (io), M34 MGTREFCLK1N_219 (io), M37 MGTHRXP2_218 (io), M38 MGTHRXN2_218 (io), M41 MGTHTXP2_218 (io), M42 MGTHTXN2_218 (io), N35 MGTREFCLK0P_218 (io), N36 MGTREFCLK0N_218 (io), N39 MGTHRXP1_218 (io), N40 MGTHRXN1_218 (io), N43 MGTHTXP1_218 (io), N44 MGTHTXN1_218 (io), P33 MGTREFCLK1P_218 (io), P34 MGTREFCLK1N_218 (io), P37 MGTHRXP0_218 (io), P38 MGTHRXN0_218 (io), P41 MGTHTXP0_218 (io), P42 MGTHTXN0_218 (io)
part Q pins: A35 MGTHRXP3_221 (io), A36 MGTHRXN3_221 (io), A39 MGTHTXP3_221 (io), A40 MGTHTXN3_221 (io), B33 MGTHRXP2_221 (io), B34 MGTHRXN2_221 (io), B37 MGTHTXP2_221 (io), B38 MGTHTXN2_221 (io), B41 MGTHTXP1_221 (io), B42 MGTHTXN1_221 (io), C35 MGTHRXP1_221 (io), C36 MGTHRXN1_221 (io), C39 MGTHTXP0_221 (io), C40 MGTHTXN0_221 (io), C43 MGTHTXP3_220 (io), C44 MGTHTXN3_220 (io), D33 MGTHRXP0_221 (io), D34 MGTHRXN0_221 (io), D37 MGTHRXP3_220 (io), D38 MGTHRXN3_220 (io), D41 MGTHTXP2_220 (io), D42 MGTHTXN2_220 (io), E35 MGTHRXP2_220 (io), E36 MGTHRXN2_220 (io), E39 MGTHRXP1_220 (io), E40 MGTHRXN1_220 (io), E43 MGTHTXP1_220 (io), E44 MGTHTXN1_220 (io), F37 MGTHRXP0_220 (io), F38 MGTHRXN0_220 (io), F41 MGTHTXP0_220 (io), F42 MGTHTXN0_220 (io), G35 MGTREFCLK0P_221 (io), G36 MGTREFCLK0N_221 (io), H33 MGTREFCLK1P_221 (io), H34 MGTREFCLK1N_221 (io), J35 MGTREFCLK0P_220 (io), J36 MGTREFCLK0N_220 (io), K33 MGTREFCLK1P_220 (io), K34 MGTREFCLK1N_220 (io)
part R pins: AA4 MGTAVTT_G12 (power), AA8 MGTAVCC_G12 (power), AA37 MGTAVCC_G22 (power), AA41 MGTAVTT_G22 (power), AB2 MGTAVTT_G12 (power), AB10 MGTVCCAUX_G12 (power), AB35 MGTVCCAUX_G22 (power), AB43 MGTAVTT_G22 (power), AC4 MGTAVTT_G11 (power), AC41 MGTAVTT_G21 (power), AD2 MGTAVTT_G11 (power), AD6 MGTAVCC_G11 (power), AD10 MGTVCCAUX_G11 (power), AD35 MGTVCCAUX_G21 (power), AD39 MGTAVCC_G21 (power), AD43 MGTAVTT_G21 (power), AE4 MGTAVTT_G11 (power), AE8 MGTAVCC_G11 (power), AE37 MGTAVCC_G21 (power), AE41 MGTAVTT_G21 (power), AF10 MGTAVCC_G11 (power), AF35 MGTAVCC_G21 (power), AH2 MGTAVTT_G11 (power), AH6 MGTAVCC_G11 (power), AH39 MGTAVCC_G21 (power), AH43 MGTAVTT_G21 (power), AJ4 MGTAVTT_G11 (power), AJ8 MGTAVCC_G11 (power), AJ37 MGTAVCC_G21 (power), AJ41 MGTAVTT_G21 (power), AK11 MGTAVTTRCAL_115 (power), AK12 MGTRREF_115 (power), AK33 MGTRREF_215 (power), AK34 MGTAVTTRCAL_215 (power), AM2 MGTAVTT_G11 (power), AM6 MGTAVCC_G11 (power), AM10 MGTAVCC_G11 (power), AM35 MGTAVCC_G21 (power), AM39 MGTAVCC_G21 (power), AM43 MGTAVTT_G21 (power), AN4 MGTAVTT_G11 (power), AN8 MGTAVCC_G11 (power), AN37 MGTAVCC_G21 (power), AN41 MGTAVTT_G21 (power), AP2 MGTAVTT_G11 (power), AP43 MGTAVTT_G21 (power), AR4 MGTAVTT_G10 (power), AR8 MGTAVCC_G10 (power), AR11 MGTVCCAUX_G10 (power), AR34 MGTVCCAUX_G20 (power), AR37 MGTAVCC_G20 (power), AR41 MGTAVTT_G20 (power), AT2 MGTAVTT_G10 (power), AT6 MGTAVCC_G10 (power), AT39 MGTAVCC_G20 (power), AT43 MGTAVTT_G20 (power), AV2 MGTAVTT_G10 (power), AV6 MGTAVCC_G10 (power), AV10 MGTAVCC_G10 (power), AV35 MGTAVCC_G20 (power), AV39 MGTAVCC_G20 (power), AV43 MGTAVTT_G20 (power), AW4 MGTAVTT_G10 (power), AW8 MGTAVCC_G10 (power), AW37 MGTAVCC_G20 (power), AW41 MGTAVTT_G20 (power), AY11 MGTAVTTRCAL_112 (power), AY12 MGTRREF_112 (power), AY33 MGTRREF_212 (power), AY34 MGTAVTTRCAL_212 (power), B6 MGTAVTT_G13 (power), B10 MGTAVCC_G13 (power), B35 MGTAVCC_G23 (power), B39 MGTAVTT_G23 (power), BA8 MGTAVCC_G10 (power), BA37 MGTAVCC_G20 (power), BB2 MGTAVTT_G10 (power), BB6 MGTAVTT_G10 (power), BB10 MGTAVCC_G10 (power), BB35 MGTAVCC_G20 (power), BB39 MGTAVTT_G20 (power), BB43 MGTAVTT_G20 (power), BC4 MGTAVTT_G10 (power), BC8 MGTAVTT_G10 (power), BC12 MGTAVCC_G10 (power), BC33 MGTAVCC_G20 (power), BC37 MGTAVTT_G20 (power), BC41 MGTAVTT_G20 (power), C4 MGTAVTT_G13 (power), C8 MGTAVTT_G13 (power), C12 MGTAVCC_G13 (power), C33 MGTAVCC_G23 (power), C37 MGTAVTT_G23 (power), C41 MGTAVTT_G23 (power), D2 MGTAVTT_G13 (power), D43 MGTAVTT_G23 (power), E4 MGTAVTT_G13 (power), E8 MGTAVCC_G13 (power), E37 MGTAVCC_G23 (power), E41 MGTAVTT_G23 (power), F6 MGTAVCC_G13 (power), F10 MGTAVCC_G13 (power), F11 MGTAVTTRCAL_121 (power), F12 MGTRREF_121 (power), F33 MGTRREF_221 (power), F34 MGTAVTTRCAL_221 (power), F35 MGTAVCC_G23 (power), F39 MGTAVCC_G23 (power), H2 MGTAVTT_G13 (power), H43 MGTAVTT_G23 (power), J4 MGTAVTT_G13 (power), J8 MGTAVCC_G13 (power), J37 MGTAVCC_G23 (power), J41 MGTAVTT_G23 (power), K2 MGTAVTT_G13 (power), K6 MGTAVCC_G13 (power), K10 MGTAVCC_G13 (power), K35 MGTAVCC_G23 (power), K39 MGTAVCC_G23 (power), K43 MGTAVTT_G23 (power), L4 MGTAVTT_G12 (power), L11 MGTVCCAUX_G13 (power), L34 MGTVCCAUX_G23 (power), L41 MGTAVTT_G22 (power), M2 MGTAVTT_G12 (power), M6 MGTAVCC_G12 (power), M39 MGTAVCC_G22 (power), M43 MGTAVTT_G22 (power), N4 MGTAVTT_G12 (power), N8 MGTAVCC_G12 (power), N37 MGTAVCC_G22 (power), N41 MGTAVTT_G22 (power), P10 MGTAVCC_G12 (power), P35 MGTAVCC_G22 (power), T2 MGTAVTT_G12 (power), T6 MGTAVCC_G12 (power), T11 MGTAVTTRCAL_118 (power), T12 MGTRREF_118 (power), T33 MGTRREF_218 (power), T34 MGTAVTTRCAL_218 (power), T39 MGTAVCC_G22 (power), T43 MGTAVTT_G22 (power), U4 MGTAVTT_G12 (power), U8 MGTAVCC_G12 (power), U37 MGTAVCC_G22 (power), U41 MGTAVTT_G22 (power), Y2 MGTAVTT_G12 (power), Y6 MGTAVCC_G12 (power), Y10 MGTAVCC_G12 (power), Y35 MGTAVCC_G22 (power), Y39 MGTAVCC_G22 (power), Y43 MGTAVTT_G22 (power)